# Altium footprint library SMPSProject.PcbLib: 143 footprints (part 7 of 9)
Each footprint in its own frame and in the unit in brackets; x right, y up, seen from the top. Pads: shape width x height; smd on the part's side, far side on the other; paste and mask are expansions set on the pad; w line width, h text height; cw(c..) or ccw(c..) is an arc to the next point about the centre after c.
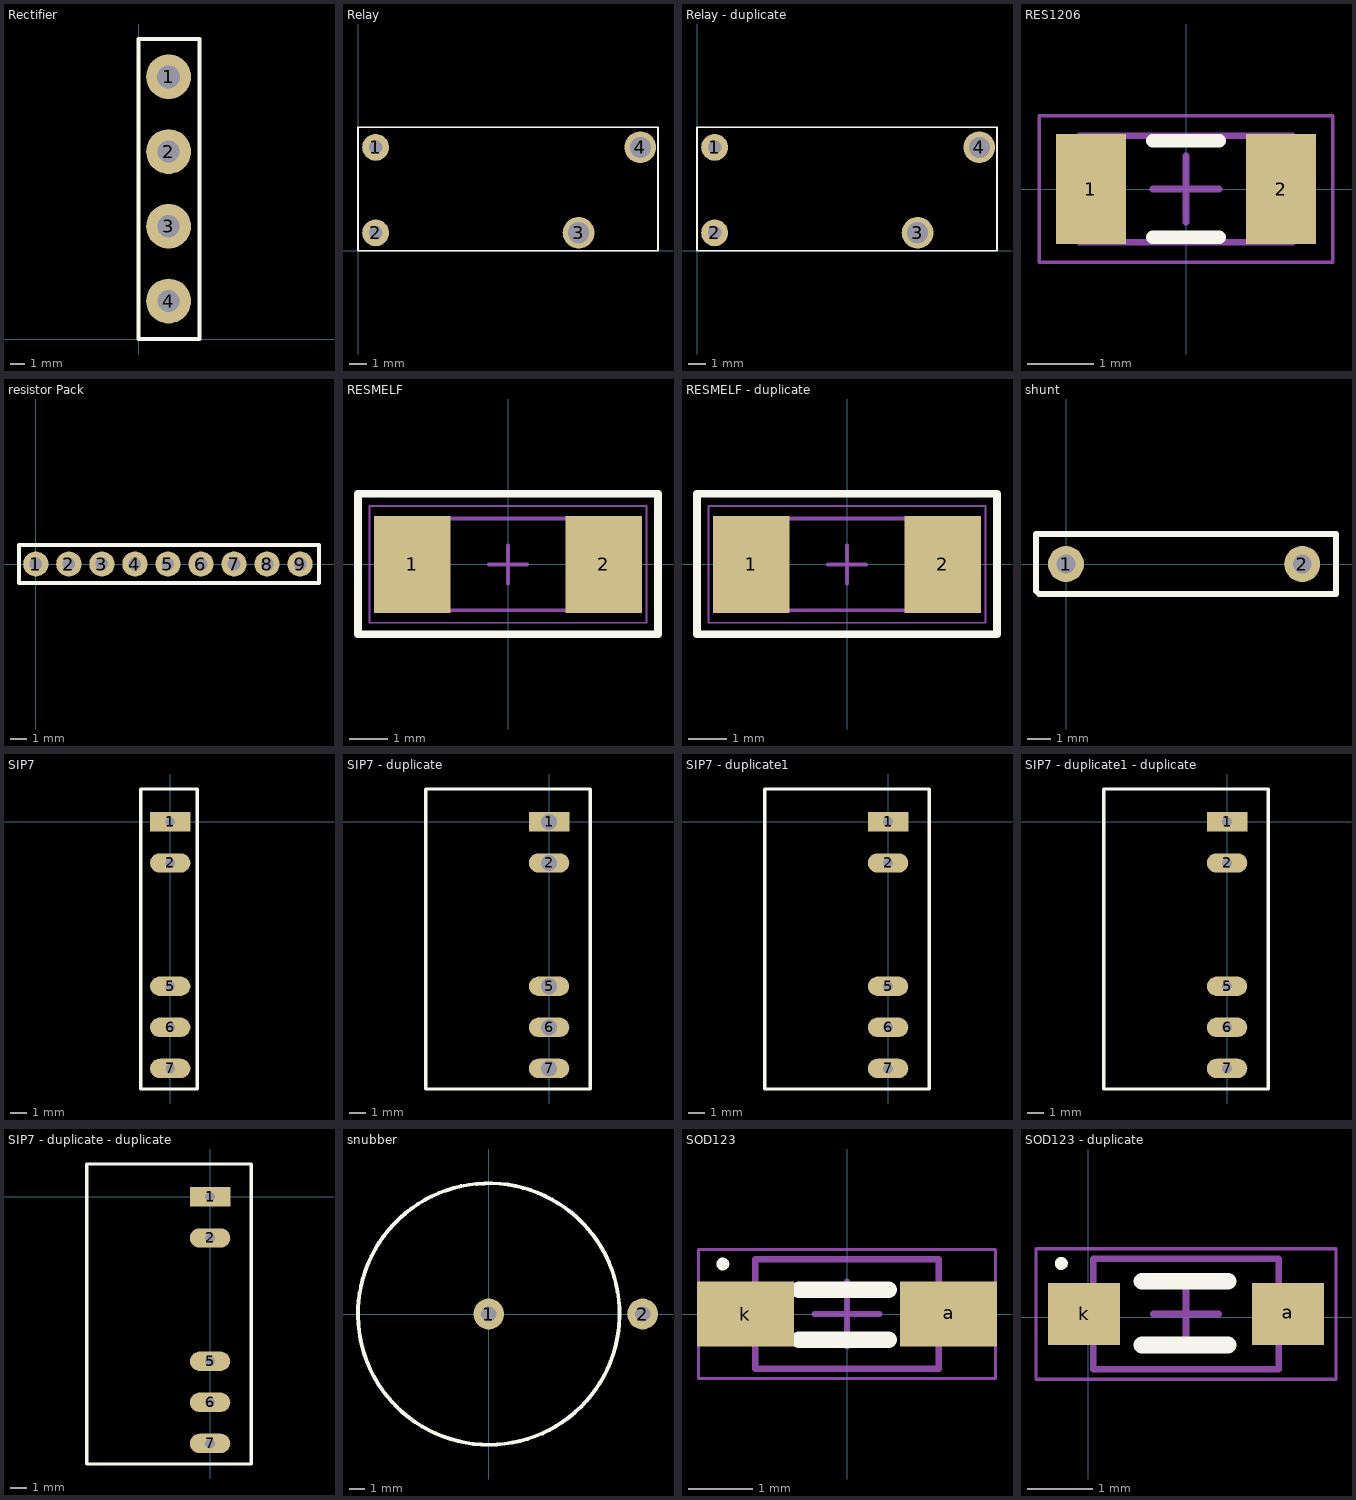
[diagram p6: the footprints below, top view; thin cyan lines are the x and y axes]

## Rectifier [mm]
pads (4):
  round 3 hole 1.54: 1(2,17.54)
  round 3 hole 1.5: 2(2,12.54) 3(2,7.54) 4(2,2.54)
Top Overlay:
  lines w0.254: 0,0 4.064,0 4.064,20.066 0,20.066 0,0
3D body "User Library-GBU10A.STEP": height 21.16, standoff -15.74, extent -1.143,-1.117 2.467,21.183

## Relay [mm]
pads (4):
  round 1.524 hole 0.762: 1(1,5.86) 2(1,1.016)
  round 1.8 hole 1.2: 3(12.5,1.016) 4(16,5.86)
Top Overlay:
  lines w0.1: 0,0 17,0 17,7 0,7 0,0

## Relay - duplicate [mm]
pads (4):
  round 1.524 hole 0.762: 1(1,5.86) 2(1,1.016)
  round 1.8 hole 1.2: 3(12.5,1.016) 4(16,5.86)
Top Overlay:
  lines w0.1: 0,0 17,0 17,7 0,7 0,0

## RES1206 [mm] "Chip Resistor, 2-Leads, Body 3,15x1,58mm, IPC Medium Density"
height 0.6
pads (2):
  rect 1.05x1.65 smd: 1(-1.425,0) 2(1.425,0)
Top Overlay:
  lines w0.2: -0.5,-0.725 0.5,-0.725 ; -0.5,0.725 0.5,0.725
Top Courtyard:
  lines w0.05: -2.2,-1.1 -2.2,1.1 2.2,1.1 2.2,-1.1 -2.2,-1.1
  lines w0.1: -0.5,0 0.5,0 ; 0,-0.5 0,0.5
Top Assembly:
  lines w0.1: -1.6,-0.8 -1.6,0.8 1.6,0.8 1.6,-0.8 -1.6,-0.8
3D body "User Library-CR3216-1206.step": height 0.61, standoff 0.01, extent -1.6,-0.775 1.6,0.825

## resistor Pack [mil]
pads (9):
  round 60 hole 30: 1(0,0) 2(78.74,0) 3(157.48,0) 4(236.22,0) 5(314.96,0) 6(393.7,0) 7(472.44,0) 8(551.18,0) 9(629.92,0)
Top Overlay:
  lines w10: -40,-45 675,-45 675,45 -40,45 -40,-45

## RESMELF [mm] "MELF Resistor, 2-Leads, Body 5.85x2.30mm, IPC Medium Density"
height 2.4
pads (2):
  rect 2x2.55 smd: 1(-2.5,0) 2(2.5,0)
Top Overlay:
  lines w0.2: -3.925,-1.825 -3.925,1.85 -1.572,1.85 -0.191,1.85 2.082,1.85 ; -3.9,-1.825 -1.2,-1.825 3.925,-1.825 3.925,1.85 ; 2.082,1.85 3.925,1.85 ; 2.082,1.85 3.925,1.85
Top Courtyard:
  lines w0.05: -3.625,-1.525 -3.625,1.525 3.625,1.525 3.625,-1.525 -3.625,-1.525
  lines w0.1: -0.5,0 0.5,0 ; 0,-0.5 0,0.5
Top Assembly:
  lines w0.1: -2.95,-1.2 -2.95,1.2 2.95,1.2 2.95,-1.2 -2.95,-1.2
3D body: height 2.39, standoff 0, extent -2.95,-1.2 -2.4,1.195
3D body: height 2.39, standoff 0, extent 2.4,-1.2 2.95,1.195
3D body "User Library-MMB0207_102K.STEP": height 2.4, standoff 0, extent -2.9,-1.2 2.9,1.2

## RESMELF - duplicate [mm] "MELF Resistor, 2-Leads, Body 5.85x2.30mm, IPC Medium Density"
height 2.4
pads (2):
  rect 2x2.55 smd: 1(-2.5,0) 2(2.5,0)
Top Overlay:
  lines w0.2: -3.925,-1.825 -3.925,1.85 -1.572,1.85 -0.191,1.85 2.082,1.85 ; -3.9,-1.825 -1.2,-1.825 3.925,-1.825 3.925,1.85 ; 2.082,1.85 3.925,1.85 ; 2.082,1.85 3.925,1.85
Top Courtyard:
  lines w0.05: -3.625,-1.525 -3.625,1.525 3.625,1.525 3.625,-1.525 -3.625,-1.525
  lines w0.1: -0.5,0 0.5,0 ; 0,-0.5 0,0.5
Top Assembly:
  lines w0.1: -2.95,-1.2 -2.95,1.2 2.95,1.2 2.95,-1.2 -2.95,-1.2
3D body: height 2.39, standoff 0, extent -2.95,-1.2 -2.4,1.195
3D body: height 2.39, standoff 0, extent 2.4,-1.2 2.95,1.195
3D body "User Library-MMB0207_102K.STEP": height 2.4, standoff 0, extent -2.9,-1.2 2.9,1.2

## shunt [mil]
pads (2):
  round 60 hole 31.5: 1(0,0) 2(393.7,0)
Top Overlay:
  lines w10: -50,-45 -50,50 450,50 450,-50 -45,-50 -50,-45

## SIP7 [mm]
pads (5):
  rect 2.5x1.2 hole 0.6: 1(0,0)
  oval 2.5x1.2 hole 0.6: 2(0,-2.54) 5(0,-10.16) 6(0,-12.7) 7(0,-15.24)
Top Overlay:
  lines w0.2: -1.825,-16.51 -1.825,2.032 1.675,2.032 1.675,-16.51 -1.825,-16.51

## SIP7 - duplicate [mm]
pads (5):
  rect 2.5x1.2 hole 1: 1(0,0)
  oval 2.5x1.2 hole 1: 2(0,-2.54) 5(0,-10.16) 6(0,-12.7) 7(0,-15.24)
Top Overlay:
  lines w0.2: -7.616,-16.51 -7.616,2.032 2.54,2.032 2.54,-16.51 -7.616,-16.51
3D body "mps_dcdc_mgj2d_sc_a.step": height 11.66, standoff -4.94, extent -7.239,-17.243 2.581,2.257

## SIP7 - duplicate1 [mm]
pads (5):
  rect 2.5x1.2 hole 0.6: 1(0,0)
  oval 2.5x1.2 hole 0.6: 2(0,-2.54) 5(0,-10.16) 6(0,-12.7) 7(0,-15.24)
Top Overlay:
  lines w0.2: -7.616,-16.51 -7.616,2.032 2.54,2.032 2.54,-16.51 -7.616,-16.51
3D body "mps_dcdc_mgj2d_sc_a.step": height 11.66, standoff -4.94, extent -7.239,-17.243 2.581,2.257

## SIP7 - duplicate1 - duplicate [mm]
pads (5):
  rect 2.5x1.2 hole 0.6: 1(0,0)
  oval 2.5x1.2 hole 0.6: 2(0,-2.54) 5(0,-10.16) 6(0,-12.7) 7(0,-15.24)
Top Overlay:
  lines w0.2: -7.616,-16.51 -7.616,2.032 2.54,2.032 2.54,-16.51 -7.616,-16.51
3D body "mps_dcdc_mgj2d_sc_a.step": height 11.66, standoff -4.94, extent -7.239,-17.243 2.581,2.257

## SIP7 - duplicate - duplicate [mm]
pads (5):
  rect 2.5x1.2 hole 0.6: 1(0,0)
  oval 2.5x1.2 hole 0.6: 2(0,-2.54) 5(0,-10.16) 6(0,-12.7) 7(0,-15.24)
Top Overlay:
  lines w0.2: -7.616,-16.51 2.54,-16.51 2.54,2.032 -7.616,2.032 -7.616,-16.51
3D body "mps_dcdc_mgj2d_sc_a.step": height 11.66, standoff -4.94, extent -7.239,-17.243 2.581,2.257

## snubber [mm]
pads (2):
  round 2 hole 1: 1(0,0) 2(10,0)
Top Overlay:
  lines w0.254: 8.478,-0.61 cw(c0,0) 8.478,-0.606
3D body "User Library-Axial Resistor-Vertical.STEP": height 18.24, standoff -1.91, extent -3.048,-3.048 5.486,3.048

## SOD123 [mm]
height 1.35
pads (2):
  rect 1.5x1 smd: a(1.575,0) k(-1.575,0)
Top Overlay:
  circle w0.1: c-1.925,0.775 r0.05
  lines w0.254: -0.75,-0.4 0.65,-0.4 ; -0.75,0.375 0.65,0.375
Top Courtyard:
  lines w0.05: -2.3,-1 -2.3,1 2.3,1 2.3,-1 -2.3,-1
  lines w0.1: -0.5,0 0.5,0 ; 0,-0.5 0,0.5
Top Assembly:
  lines w0.1: -1.425,-0.85 -1.425,0.85 1.425,0.85 1.425,-0.85 -1.425,-0.85
3D body "CircuitWorks-SOD123.STEP": height 1.28, standoff 0.01, extent -1.85,-0.8 1.85,0.8

## SOD123 - duplicate [mm]
height 1.35
pads (2):
  rect 1.1x0.95 smd: a(3.063,0.05) k(-0.062,0.05)
Top Overlay:
  circle w0.1: c-0.412,0.825 r0.05
  lines w0.254: 0.825,-0.425 2.15,-0.425 ; 0.825,0.55 2.15,0.55
Top Courtyard:
  lines w0.05: -0.8,-0.95 -0.8,1.05 3.8,1.05 3.8,-0.95 -0.8,-0.95
  lines w0.1: 1,0.05 2,0.05 ; 1.5,-0.45 1.5,0.55
Top Assembly:
  lines w0.1: 0.075,-0.8 0.075,0.9 2.925,0.9 2.925,-0.8 0.075,-0.8
3D body "CircuitWorks-SOD123.STEP": height 1.28, standoff 0.01, extent -0.375,-0.775 3.325,0.825